# Altium footprint library LimeMicroAltiumLib_pcbLib_r05.PcbLib: 746 footprints (part 6 of 48)
Each footprint in its own frame and in the unit in brackets; x right, y up, seen from the top. Pads: shape width x height; smd on the part's side, far side on the other; paste and mask are expansions set on the pad; w line width, h text height; cw(c..) or ccw(c..) is an arc to the next point about the centre after c.
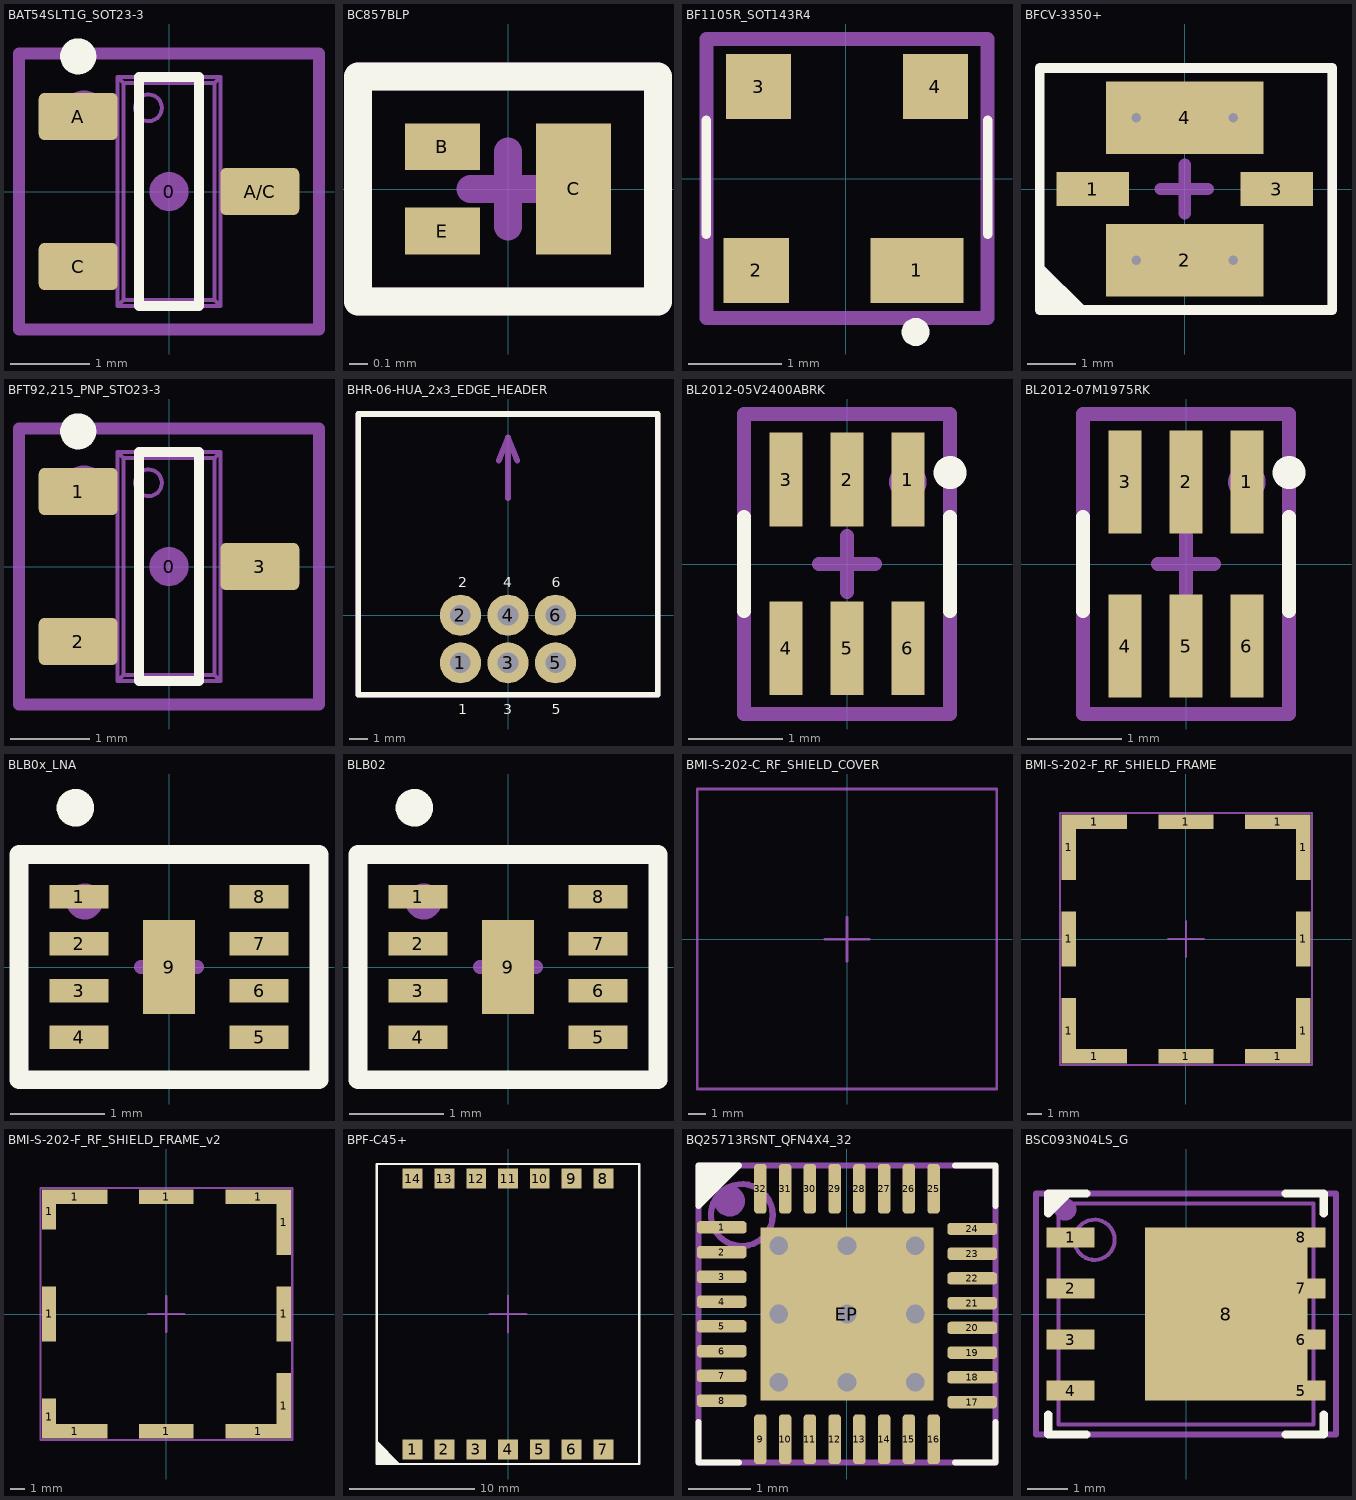
[diagram p5: the footprints below, top view; thin cyan lines are the x and y axes]

## BAT54SLT1G_SOT23-3 [mm] "SOT23, 3 pin"
height 1.003
pads (4):
  round 0.5 on Mech15: 0(0,0)
  rrect25% 1x0.6 smd: A(-1.15,0.95) A/C(1.15,0) C(-1.15,-0.95)
Top Overlay:
  circle w0.254: c-1.15,1.712 r0.102
  lines w0.127: -0.381,-1.45 -0.381,1.45 0.381,1.45 0.381,-1.45 -0.381,-1.45
Mechanical 13:
  circle w0.05: c-0.26,1.06 r0.169
  lines w0.05: -1.19,-1.19 -1.19,-0.71 ; -1.19,0.71 -1.19,1.19 ; -1.099,-1.19 -1.099,-0.71 ; -1.099,0.71 -1.099,1.19 ; -1.074,-1.19 -1.074,-0.71 ; -1.074,0.71 -1.074,1.19 ; -0.825,-1.19 -0.825,-0.71 ; -0.825,0.71 -0.825,1.19 ; -0.65,-1.19 -1.4,-1.19 -1.4,-0.71 -0.65,-0.71 ; -0.65,0.71 -1.4,0.71 -1.4,1.19 -0.65,1.19 ; 0.65,-0.24 1.4,-0.24 1.4,0.24 0.65,0.24 ; 0.825,-0.24 0.825,0.24 ; 1.074,-0.24 1.074,0.24 ; 1.099,-0.24 1.099,0.24 ; 1.19,-0.24 1.19,0.24 ; -0.65,-1.45 0.65,-1.45 ; -0.65,-1.45 -0.65,1.45 ; -0.65,-1.45 -0.576,-1.376 ; -0.65,1.45 -0.576,1.376 ; -0.65,1.45 0.65,1.45 ; -0.576,-1.376 0.576,-1.376 ; -0.576,-1.376 -0.576,1.376 ; -0.576,1.376 0.576,1.376 ; 0.576,-1.376 0.65,-1.45 ; 0.576,-1.376 0.576,1.376 ; 0.576,1.376 0.65,1.45 ; 0.65,-1.45 0.65,1.45
Mechanical 15:
  circle w0.35: c-1.073,0.975 r0.127
  lines w0.15: -1.9,-1.75 -1.9,1.75 1.9,1.75 1.9,-1.75 -1.9,-1.75
  text ".Designator" at 0,0 h0.55
3D body "SOT23-3.STEP": height 1.29, standoff -0.01, extent -1.4,-1.45 1.4,1.45

## BC857BLP [mm]
pads (3):
  rect 0.4x0.25 smd mask+0.05: B(-0.35,0.225) E(-0.35,-0.225)
  rect 0.4x0.7 smd mask+0.05: C(0.35,0)
Top Overlay:
  lines w0.15: -0.8,-0.6 0.8,-0.6 0.8,0.6 -0.8,0.6 -0.8,-0.6
Mechanical 15:
  lines w0.15: -0.2,0 0.2,0 ; 0,-0.2 0,0.2 ; -0.8,-0.6 -0.8,0.6 0.8,0.6 0.8,-0.6 -0.8,-0.6
  text ".Designator" at 0,0 h0.55
3D body: height 0.5, standoff 0, extent -0.5,-0.3 0.5,0.3

## BF1105R_SOT143R4 [mm] "RF MOSFET Transistors Trans MOSFET N-CH 7V 0.03A 4pin(3+Tab). SOT-143R-4 package"
pads (4):
  rect 1x0.7 smd: 1(0.763,-0.987)
  rect 0.7x0.7 smd: 2(-0.962,-0.987) 3(-0.937,0.988) 4(0.963,0.988)
Top Overlay:
  circle w0.15: c0.75,-1.65 r0.075
  lines w0.1: -1.5,-0.6 -1.5,0.625 ; 1.525,-0.6 1.525,0.625
Mechanical 15:
  circle w0.15: c0.75,-0.975 r0.056
  lines w0.15: -1.5,-1.5 -1.5,1.5 1.525,1.5 1.525,-1.5 -1.5,-1.5
  text ".Designator" at 0,0 h0.55
3D body "User Library-SOT143R.STEP": height 0.95, standoff 0.02, extent -1.438,-1.262 1.463,1.238

## BFCV-3350+ [mm]
pads (4):
  rect 1.5x0.7 smd: 1(-1.9,0) 3(1.9,0)
  rect 3.25x1.5 smd: 2(0,-1.475) 4(0,1.475)
via -1,1.475 diameter 0.5 hole 0.2
via 1,1.475 diameter 0.5 hole 0.2
via 1,-1.475 diameter 0.5 hole 0.2
via -1,-1.475 diameter 0.5 hole 0.2
Top Overlay:
  region: -2,-2.5 -3,-1.5 -3,-2.5
  lines w0.2: -3,-2.5 3.05,-2.5 3.05,2.5 -3,2.5 -3,-1.8 -3,-2.5
Mechanical 15:
  lines w0.1: -3,-2.5 -3,2.5 3,2.5 3,-2.5 -3,-2.5
  lines w0.254: -0.5,0 0,0 ; 0,-0.5 0,0 ; 0,0.5 0,0 ; 0.475,0 0,0
  text "1" at -2,0 h0.55
  text ".Designator" at 0,0 h0.55
3D body: height 1, standoff 0, extent -1.6,-1.25 1.6,1.25
3D body: height 1.01, standoff 0, extent -0.948,-0.2 -0.55,0.2

## BFT92,215_PNP_STO23-3 [mm]
pads (4):
  round 0.5 on Mech15: 0(0,0)
  rrect25% 1x0.6 smd: 1(-1.15,0.95) 2(-1.15,-0.95) 3(1.15,0)
Top Overlay:
  circle w0.254: c-1.15,1.712 r0.102
  lines w0.127: -0.381,-1.45 -0.381,1.45 0.381,1.45 0.381,-1.45 -0.381,-1.45
Mechanical 13:
  circle w0.05: c-0.26,1.06 r0.169
  lines w0.05: -1.19,-1.19 -1.19,-0.71 ; -1.19,0.71 -1.19,1.19 ; -1.099,-1.19 -1.099,-0.71 ; -1.099,0.71 -1.099,1.19 ; -1.074,-1.19 -1.074,-0.71 ; -1.074,0.71 -1.074,1.19 ; -0.825,-1.19 -0.825,-0.71 ; -0.825,0.71 -0.825,1.19 ; -0.65,-1.19 -1.4,-1.19 -1.4,-0.71 -0.65,-0.71 ; -0.65,0.71 -1.4,0.71 -1.4,1.19 -0.65,1.19 ; 0.65,-0.24 1.4,-0.24 1.4,0.24 0.65,0.24 ; 0.825,-0.24 0.825,0.24 ; 1.074,-0.24 1.074,0.24 ; 1.099,-0.24 1.099,0.24 ; 1.19,-0.24 1.19,0.24 ; -0.65,-1.45 0.65,-1.45 ; -0.65,-1.45 -0.65,1.45 ; -0.65,-1.45 -0.576,-1.376 ; -0.65,1.45 -0.576,1.376 ; -0.65,1.45 0.65,1.45 ; -0.576,-1.376 0.576,-1.376 ; -0.576,-1.376 -0.576,1.376 ; -0.576,1.376 0.576,1.376 ; 0.576,-1.376 0.65,-1.45 ; 0.576,-1.376 0.576,1.376 ; 0.576,1.376 0.65,1.45 ; 0.65,-1.45 0.65,1.45
Mechanical 15:
  circle w0.35: c-1.073,0.975 r0.127
  lines w0.15: -1.9,-1.75 -1.9,1.75 1.9,1.75 1.9,-1.75 -1.9,-1.75
  text ".Designator" at 0,0 h0.55
3D body "SOT23-3.STEP": height 1.29, standoff -0.01, extent -1.4,-1.45 1.4,1.45

## BHR-06-HUA_2x3_EDGE_HEADER [mm]
pads (6):
  round 2.2 hole 1.1 mask+0.05: 1(-2.54,-2.54) 2(-2.54,0) 3(0,-2.54) 4(0,0) 5(2.54,-2.54) 6(2.54,0)
Top Overlay:
  lines w0.3: -8,-4.25 -8,10.75 8,10.75 8,-4.25 -8,-4.25
  text "1" at -2.65,-5.275 h0.55
  text "3" at -0.25,-5.275 h0.55
  text "5" at 2.35,-5.275 h0.55
  text "6" at 2.35,1.5 h0.55
  text "4" at -0.25,1.5 h0.55
  text "2" at -2.65,1.5 h0.55
Mechanical 15:
  lines w0.3: -0.5,8.25 0,9.5 ; 0,6.25 0,9.5 ; 0.5,8.25 0,9.5 ; -8,-4.25 8,-4.25 8,10.75 -8,10.75 -8,-4.25
  text ".Designator" at 0,3.9 h0.55
  text "4" at -0.25,-0.2 h0.55
  text "6" at 2.35,-0.2 h0.55
  text "2" at -2.65,-0.2 h0.55
  text "3" at -0.15,-2.7 h0.55
  text "5" at 2.45,-2.7 h0.55
  text "1" at -2.55,-2.7 h0.55
  text "Board edge" at -2.25,5.5 h0.55
3D body "61200621721_Download_STP_61200621721_rev1.stp": height 8.93, standoff -2.9, extent -7.64,-2.865 7.64,10.685

## BL2012-05V2400ABRK [mm]
pads (6):
  rect 0.35x1 smd mask+0.05: 1(0.65,0.9) 2(0,0.9) 3(-0.65,0.9) 4(-0.65,-0.9) 5(0,-0.9) 6(0.65,-0.9)
Top Overlay:
  circle w0.3: c1.1,0.975 r0.025
  lines w0.15: -1.1,-0.5 -1.1,0.5 ; 1.1,-0.5 1.1,0.5
Mechanical 15:
  circle w0.3: c0.65,0.875 r0.05
  lines w0.15: -0.3,0 0.3,0 ; 0,-0.3 0,0.3 ; -1.1,-1.6 -1.1,1.6 1.1,1.6 1.1,-1.6 -1.1,-1.6
  text ".Designator" at 0,0 h0.55
3D body: height 0.95, standoff 0, extent -1,-1 1,1
3D body: height 0.96, standoff 0, extent 0.5,0.725 0.8,1.037
3D body: height 0.96, standoff 0, extent 0.4,-0.2 0.8,0.2
3D body: height 0.96, standoff 0, extent -0.15,0.725 0.15,1.037
3D body: height 0.96, standoff 0, extent -0.8,0.725 -0.5,1.037
3D body: height 0.96, standoff 0, extent -0.8,-1.037 -0.5,-0.725
3D body: height 0.96, standoff 0, extent -0.15,-1.037 0.15,-0.725
3D body: height 0.96, standoff 0, extent 0.5,-1.037 0.8,-0.725

## BL2012-07M1975RK [mm]
pads (6):
  rect 0.35x1.1 smd mask+0.05: 1(0.65,0.875) 2(0,0.875) 3(-0.65,0.875) 4(-0.65,-0.875) 5(0,-0.875) 6(0.65,-0.875)
Top Overlay:
  circle w0.3: c1.1,0.975 r0.025
  lines w0.15: -1.1,-0.5 -1.1,0.5 ; 1.1,-0.5 1.1,0.5
Mechanical 15:
  circle w0.3: c0.65,0.875 r0.05
  lines w0.15: -0.3,0 0.3,0 ; 0,-0.3 0,0.3 ; -1.1,-1.6 1.1,-1.6 1.1,1.6 -1.1,1.6 -1.1,-1.6
  text ".Designator" at 0,0 h0.55
3D body: height 0.96, standoff 0, extent 0.338,-0.125 0.613,0.125
3D body: height 0.96, standoff 0, extent 0.5,0.512 0.8,0.637
3D body: height 0.96, standoff 0, extent -0.8,0.513 -0.5,0.638
3D body: height 0.96, standoff 0, extent -0.15,0.512 0.15,0.637
3D body: height 0.96, standoff 0, extent 0.5,-0.637 0.8,-0.512
3D body: height 0.96, standoff 0, extent -0.15,-0.637 0.15,-0.512
3D body: height 0.96, standoff 0, extent -0.8,-0.637 -0.5,-0.512
3D body: height 0.95, standoff 0, extent -1,-0.625 1,0.625

## BLB0x_LNA [mm] "BLB01 and BLB02 footprint"
pads (9):
  rect 0.625x0.25 smd mask+0.05: 1(-0.96,0.75) 2(-0.96,0.25) 3(-0.96,-0.25) 4(-0.96,-0.75) 5(0.96,-0.75) 6(0.96,-0.25) 7(0.96,0.25) 8(0.96,0.75)
  rect 0.56x1 smd mask+0.05: 9(0,0)
Top Overlay:
  circle w0.2: c-1,1.7 r0.1
  lines w0.2: -1.6,-1.2 1.6,-1.2 1.6,1.2 -1.6,1.2 -1.6,-1.2
Mechanical 15:
  circle w0.254: c-0.9,0.7 r0.064
  lines w0.15: -0.3,0 0.3,0 ; 0,-0.3 0,0.3 ; -1.6,-1.2 -1.6,1.2 1.6,1.2 1.6,-1.2 -1.6,-1.2
  text ".Designator" at 0,0 h0.55
3D body: height 0.6, standoff 0, extent -1.1,-1.1 1.1,1.1
3D body: height 0.61, standoff 0, extent -0.949,0.65 -0.65,0.95

## BLB02 [mm]
pads (9):
  rect 0.625x0.25 smd mask+0.05: 1(-0.96,0.75) 2(-0.96,0.25) 3(-0.96,-0.25) 4(-0.96,-0.75) 5(0.96,-0.75) 6(0.96,-0.25) 7(0.96,0.25) 8(0.96,0.75)
  rect 0.56x1 smd mask+0.05: 9(0,0)
Top Overlay:
  circle w0.2: c-1,1.7 r0.1
  lines w0.2: -1.6,-1.2 1.6,-1.2 1.6,1.2 -1.6,1.2 -1.6,-1.2
Mechanical 15:
  circle w0.254: c-0.9,0.7 r0.064
  lines w0.15: -0.3,0 0.3,0 ; 0,-0.3 0,0.3 ; -1.6,-1.2 -1.6,1.2 1.6,1.2 1.6,-1.2 -1.6,-1.2
  text ".Designator" at 0,0 h0.55
3D body: height 0.6, standoff 0, extent -1.1,-1.1 1.1,1.1
3D body: height 0.61, standoff 0, extent -0.949,0.65 -0.65,0.95

## BMI-S-202-C_RF_SHIELD_COVER [mm]
Mechanical 15:
  lines w0.15: -1.25,0 0,0 ; 0,-1.25 0,0 ; 0,1.25 0,0 ; 1.25,0 0,0 ; -8.475,-8.475 8.475,-8.475 8.475,8.5 -8.475,8.5 -8.475,-8.475
  text "Shield Cover" at -8.175,-8.125 h0.55
  text ".Designator" at 0,0 h0.55
3D body "bmi-s-202-c-stp-file.STEP": height 4.03, standoff 2.03, extent -8.48,-8.48 8.48,8.48

## BMI-S-202-F_RF_SHIELD_FRAME [mm]
pads (12):
  rect 1x4.55 smd paste-2 mask+0.05: 1(-8.15,-6.375) 1(-8.15,6.375) 1(8.15,-6.375) 1(8.15,6.375)
  rect 1x3.8 smd mask+0.05: 1(-8.15,0) 1(8.15,0)
  rect 4.55x1 smd mask+0.05: 1(-6.375,-8.15) 1(-6.375,8.15) 1(6.375,-8.15) 1(6.375,8.15)
  rect 3.8x1 smd mask+0.05: 1(0,-8.15) 1(0,8.15)
Top Paste:
  region: 8.65,7.45 7.65,7.45 7.65,4.1 8.65,4.1
  rectangle: 7.65,-7.45 8.65,-4.1
  rectangle: -8.65,-7.45 -7.65,-4.1
  rectangle: -8.65,4.1 -7.65,7.45
Mechanical 15:
  lines w0.15: -1.25,0 0,0 ; 0,-1.25 0,0 ; 0,1.25 0,0 ; 1.25,0 0,0 ; -8.75,-8.75 -8.75,8.75 8.75,8.75 8.75,-8.75 -8.75,-8.75
  text "Shield Frame" at -7.875,-8.375 h0.55
  text ".Designator" at 0,0 h0.55
3D body: height 3.6, standoff 3.5, extent -8.05,6.65 8.05,8.25
3D body: height 3.6, standoff 0.5, extent -8.05,8.05 8.05,8.25
3D body: height 3.6, standoff 0.5, extent -8.05,-8.25 8.05,-8.05
3D body: height 3.6, standoff 3.5, extent -8.05,-8.25 8.05,-6.65
3D body: height 3.6, standoff 3.5, extent -3,-3 3,3
3D body: height 3.6, standoff 3.5, extent 3,-0.7 7.15,0.7
3D body: height 0.5, standoff 0, extent 4.4,8.05 8.05,8.25
3D body: height 0.5, standoff 0, extent 4.4,-8.25 8.05,-8.05
3D body: height 3.6, standoff 3.5, extent 6.65,-8.05 8.25,8.05
3D body: height 3.6, standoff 3.5, extent -0.7,3 0.7,7.15
3D body: height 3.6, standoff 3.5, extent -0.7,-7.15 0.7,-3
3D body: height 3.6, standoff 3.5, extent -7.15,-0.7 -3,0.7
3D body: height 0.5, standoff 0, extent -1.5,8.05 1.5,8.25
3D body: height 0.5, standoff 0, extent -1.5,-8.25 1.5,-8.05
3D body: height 0.5, standoff 0, extent -8.05,8.05 -4.4,8.25
3D body: height 0.5, standoff 0, extent -8.05,-8.25 -4.4,-8.05
3D body: height 3.6, standoff 0.5, extent 8.05,-8.05 8.25,8.05
3D body: height 3.6, standoff 3.5, extent -8.25,-8.05 -6.65,8.05
3D body: height 3.6, standoff 0.5, extent -8.25,-8.05 -8.05,8.05
3D body: height 0.5, standoff 0, extent 8.05,4.4 8.25,8.05
3D body: height 0.5, standoff 0, extent -8.25,4.4 -8.05,8.05
3D body: height 0.5, standoff 0, extent 8.05,-1.5 8.25,1.5
3D body: height 0.5, standoff 0, extent 8.05,-8.05 8.25,-4.4
3D body: height 0.5, standoff 0, extent -8.25,-1.5 -8.05,1.5
3D body: height 0.5, standoff 0, extent -8.25,-8.05 -8.05,-4.4

## BMI-S-202-F_RF_SHIELD_FRAME_v2 [mm]
pads (12):
  rect 1x2.5 smd mask+0.05: 1(-8.15,-7.125) 1(-8.15,7.125)
  rect 1x3.8 smd mask+0.05: 1(-8.15,0) 1(8.15,0)
  rect 4.55x1 smd mask+0.05: 1(-6.375,-8.15) 1(-6.375,8.15) 1(6.375,-8.15) 1(6.375,8.15)
  rect 3.8x1 smd mask+0.05: 1(0,-8.15) 1(0,8.15)
  rect 1x4.55 smd mask+0.05: 1(8.15,-6.375) 1(8.15,6.375)
Mechanical 15:
  lines w0.15: -1.25,0 0,0 ; 0,-1.25 0,0 ; 0,1.25 0,0 ; 1.25,0 0,0 ; -8.75,-8.75 -8.75,8.75 8.75,8.75 8.75,-8.75 -8.75,-8.75
  text ".Designator" at 0,0 h0.55
  text "Shield Frame" at -7.875,-8.375 h0.55
3D body: height 3.6, standoff 3.5, extent -8.05,6.65 8.05,8.25
3D body: height 3.6, standoff 0.5, extent -8.05,8.05 8.05,8.25
3D body: height 3.6, standoff 0.5, extent -8.05,-8.25 8.05,-8.05
3D body: height 3.6, standoff 3.5, extent -8.05,-8.25 8.05,-6.65
3D body: height 3.6, standoff 3.5, extent -3,-3 3,3
3D body: height 3.6, standoff 3.5, extent 3,-0.7 7.15,0.7
3D body: height 0.5, standoff 0, extent 4.4,8.05 8.05,8.25
3D body: height 0.5, standoff 0, extent 4.4,-8.25 8.05,-8.05
3D body: height 3.6, standoff 3.5, extent 6.65,-8.05 8.25,8.05
3D body: height 3.6, standoff 3.5, extent -0.7,3 0.7,7.15
3D body: height 3.6, standoff 3.5, extent -0.7,-7.15 0.7,-3
3D body: height 3.6, standoff 3.5, extent -7.15,-0.7 -3,0.7
3D body: height 0.5, standoff 0, extent -1.5,8.05 1.5,8.25
3D body: height 0.5, standoff 0, extent -1.5,-8.25 1.5,-8.05
3D body: height 0.5, standoff 0, extent -8.05,8.05 -4.4,8.25
3D body: height 0.5, standoff 0, extent -8.05,-8.25 -4.4,-8.05
3D body: height 3.6, standoff 0.5, extent 8.05,-8.05 8.25,8.05
3D body: height 3.6, standoff 3.5, extent -8.25,-8.05 -6.65,8.05
3D body: height 3.6, standoff 0.5, extent -8.25,-8.05 -8.05,8.05
3D body: height 0.5, standoff 0, extent 8.05,4.4 8.25,8.05
3D body: height 0.5, standoff 0, extent -8.25,4.4 -8.05,8.05
3D body: height 0.5, standoff 0, extent 8.05,-1.5 8.25,1.5
3D body: height 0.5, standoff 0, extent 8.05,-8.05 8.25,-4.4
3D body: height 0.5, standoff 0, extent -8.25,-1.5 -8.05,1.5
3D body: height 0.5, standoff 0, extent -8.25,-8.05 -8.05,-4.4

## BPF-C45+ [mm]
height 6.35
pads (14):
  rect 1.6x1.6 smd mask+0.05: 1(-7.62,-10.83) 2(-5.08,-10.83) 3(-2.54,-10.83) 4(0,-10.83) 5(2.54,-10.83) 6(5.08,-10.83) 7(7.62,-10.83) 8(7.62,10.83) 9(5.08,10.83) 10(2.54,10.83) 11(0,10.83) 12(-2.54,10.83) 13(-5.08,10.83) 14(-7.62,10.83)
Top Overlay:
  region: -10.5,-10.1 -10.5,-12 -8.6,-12
  lines w0.2: -10.5,-12 10.5,-12 10.5,12 -10.5,12 -10.5,-12
Mechanical 15:
  circle w0.3: c-7.6,-10.8 r0.141
  lines w0.15: -1.5,0 0,0 ; 0,-1.5 0,0 ; 0,1.5 0,0 ; 1.5,0 0,0 ; -10.5,-12 -10.5,12 10.5,12 10.5,-12 -10.5,-12
  text ".Designator" at 0,0 h0.55
3D body: height 6.35, standoff 0, extent -10.15,-11.05 10.15,11.05

## BQ25713RSNT_QFN4X4_32 [mm] "QFN, 32-Leads, Body 4.15x4.15mm, Pitch 0.4mm, IPC High Density"
height 1
pads (33):
  rrect50% 0.8x0.2 smd mask+0.05: 1(-2.025,1.4) 2(-2.025,1) 3(-2.025,0.6) 4(-2.025,0.2) 5(-2.025,-0.2) 6(-2.025,-0.6) 7(-2.025,-1) 8(-2.025,-1.4) 17(2.025,-1.425) 18(2.025,-1.025) 19(2.025,-0.625) 20(2.025,-0.225) 21(2.025,0.175) 22(2.025,0.575) 23(2.025,0.975) 24(2.025,1.375)
  rrect50% 0.2x0.8 smd mask+0.05: 9(-1.4,-2.025) 10(-1,-2.025) 11(-0.6,-2.025) 12(-0.2,-2.025) 13(0.2,-2.025) 14(0.6,-2.025) 15(1,-2.025) 16(1.4,-2.025) 25(1.4,2.025) 26(1,2.025) 27(0.6,2.025) 28(0.2,2.025) 29(-0.2,2.025) 30(-0.6,2.025) 31(-1,2.025) 32(-1.4,2.025)
  rect 2.8x2.8 smd mask+0.05: EP(0,0)
via -1.1,1.1 diameter 0.6 hole 0.3
via 0,1.1 diameter 0.6 hole 0.3
via 1.1,1.1 diameter 0.6 hole 0.3
via -1.1,0 diameter 0.6 hole 0.3
via 0,0 diameter 0.6 hole 0.3
via 1.1,0 diameter 0.6 hole 0.3
via -1.1,-1.1 diameter 0.6 hole 0.3
via 0,-1.1 diameter 0.6 hole 0.3
via 1.1,-1.1 diameter 0.6 hole 0.3
Top Overlay:
  region: -2.4,1.75 -2.4,2.4 -1.75,2.4
  lines w0.1: -2.4,-1.75 -2.4,-2.4 -1.75,-2.4 ; 1.75,-2.4 2.4,-2.4 2.4,-1.75 ; 1.75,2.4 2.4,2.4 2.4,1.75 ; -2.4,1.75 -2.4,2.4 -1.75,2.4 -2.4,1.75
Mechanical 13:
  circle w0.1: c-1.7,1.6 r0.5
  lines w0.1: -2.4,-2.4 -2.4,2.4 2.4,2.4 2.4,-2.4 -2.4,-2.4
Mechanical 15:
  circle w0.25: c-1.9,1.825 r0.125
  lines w0.1: -0.5,0 0.5,0 ; 0,-0.5 0,0.5 ; -2.4,-2.4 -2.4,2.4 2.4,2.4 2.4,-2.4 -2.4,-2.4
  text ".Designator" at 0,0 h0.55
3D body "User Library-IP101.step": height 0.91, standoff 0, extent -2.02,-2.01 2,2.01

## BSC093N04LS_G [mm] "SON, 8-Leads, Body 5,32x6,15mm, Pitch 1,27mm, Thermal Pad 3,60x4,05mm, IPC Medium Density"
height 1.1
pads (9):
  rect 1.2x0.5 smd: 1(-2.87,1.905) 2(-2.87,0.635) 3(-2.87,-0.635) 4(-2.87,-1.905) 5(2.87,-1.905) 6(2.87,-0.635) 7(2.87,0.635) 8(2.87,1.905)
  rect 4.05x4.3 smd paste-2.025: 8(1,0)
Top Overlay:
  region: -3.425,2.5 -3.425,2.995 -3.416,2.986 -2.939,2.986
  lines w0.2: -3.425,-2.5 -3.425,-2.995 -2.47,-2.995 ; -2.939,2.986 -3.425,2.5 -3.425,2.995 -2.47,2.995 ; 2.47,-2.995 3.425,-2.995 3.425,-2.5 ; 2.47,2.995 3.425,2.995 3.425,2.5
Mechanical 13:
  circle w0.1: c-2.275,1.845 r0.5
  lines w0.1: -3.175,-2.745 -3.175,2.745 3.175,2.745 3.175,-2.745 -3.175,-2.745
Mechanical 15:
  circle w0.35: c-3,2.6 r0.1
  lines w0.15: -0.5,0 0.5,0 ; 0,-0.5 0,0.5 ; -3.73,-3 -3.73,3 3.73,3 3.73,-3 -3.73,-3
  text ".Designator" at 0,0 h0.55
3D body "User Library-TDSON-8-1.step": height 1, standoff 0, extent -3.075,-2.675 3.075,2.675